# Altium schematic symbol library jlcpcb_2025_04_resistors_extended_1210.schlib: 2670 symbols (part 12 of 14) (continued)
## RTT12R47JTP
designator R?  Resistance: 470mΩ  (hidden comment: *)
Resistor, 470mΩ, ±5%, 500mW, 200V, ±200ppm/℃, -55℃~+155℃, SMD 1210; Manufacturer: Uniroyal; Manufacturer Part Number: RTT12R47JTP; Supplier 1: LCSC; Supplier Part Number 1: C159280; JLCPCB Part Number: C159280; Power Rating: 500mW; Category: Resistors; Package Size: 1210; JLCPCB Basic Part: Yes; Tolerance: ±5%; Voltage Rating: 200V; Temperature Coefficient: ±200ppm/℃; Temperature Rating: -55℃~+155℃; ComponentLink1Description: Datasheet; ComponentLink1URL: https://wmsc.lcsc.com/wmsc/upload/file/pdf/v2/lcsc/2304140030_RALEC-RTT12R47JTP_C159280.pdf; ComponentLink2Description: JLCPCB Part URL; ComponentLink2URL: https://jlcpcb.com/partdetail/C159280
pins: 1, 2
1 alternate drawing of the same symbol

## RTT12R050FTP
designator R?  Resistance: 50mΩ  (hidden comment: *)
Resistor, 50mΩ, ±1%, 500mW, 200V, ±400ppm/℃, -55℃~+155℃, SMD 1210; Manufacturer: Uniroyal; Manufacturer Part Number: RTT12R050FTP; Supplier 1: LCSC; Supplier Part Number 1: C333253; JLCPCB Part Number: C333253; Power Rating: 500mW; Category: Resistors; Package Size: 1210; JLCPCB Basic Part: Yes; Tolerance: ±1%; Voltage Rating: 200V; Temperature Coefficient: ±400ppm/℃; Temperature Rating: -55℃~+155℃; ComponentLink1Description: Datasheet; ComponentLink1URL: https://wmsc.lcsc.com/wmsc/upload/file/pdf/v2/lcsc/2304140030_RALEC-RTT12R050FTP_C333253.pdf; ComponentLink2Description: JLCPCB Part URL; ComponentLink2URL: https://jlcpcb.com/partdetail/C333253
pins: 1, 2
1 alternate drawing of the same symbol

## RTT12R50JTP
designator R?  Resistance: 500mΩ  (hidden comment: *)
Resistor, 500mΩ, ±5%, 500mW, 200V, ±200ppm/℃, -55℃~+155℃, SMD 1210; Manufacturer: Uniroyal; Manufacturer Part Number: RTT12R50JTP; Supplier 1: LCSC; Supplier Part Number 1: C159279; JLCPCB Part Number: C159279; Power Rating: 500mW; Category: Resistors; Package Size: 1210; JLCPCB Basic Part: Yes; Tolerance: ±5%; Voltage Rating: 200V; Temperature Coefficient: ±200ppm/℃; Temperature Rating: -55℃~+155℃; ComponentLink1Description: Datasheet; ComponentLink1URL: https://wmsc.lcsc.com/wmsc/upload/file/pdf/v2/lcsc/2304140030_RALEC-RTT12R50JTP_C159279.pdf; ComponentLink2Description: JLCPCB Part URL; ComponentLink2URL: https://jlcpcb.com/partdetail/C159279
pins: 1, 2
1 alternate drawing of the same symbol

## RTT12R51JTP
designator R?  Resistance: 510mΩ  (hidden comment: *)
Resistor, 510mΩ, ±5%, 500mW, 200V, ±200ppm/℃, -55℃~+155℃, SMD 1210; Manufacturer: Uniroyal; Manufacturer Part Number: RTT12R51JTP; Supplier 1: LCSC; Supplier Part Number 1: C159277; JLCPCB Part Number: C159277; Power Rating: 500mW; Category: Resistors; Package Size: 1210; JLCPCB Basic Part: Yes; Tolerance: ±5%; Voltage Rating: 200V; Temperature Coefficient: ±200ppm/℃; Temperature Rating: -55℃~+155℃; ComponentLink1Description: Datasheet; ComponentLink1URL: https://wmsc.lcsc.com/wmsc/upload/file/pdf/v2/lcsc/2304140030_RALEC-RTT12R51JTP_C159277.pdf; ComponentLink2Description: JLCPCB Part URL; ComponentLink2URL: https://jlcpcb.com/partdetail/C159277
pins: 1, 2
1 alternate drawing of the same symbol

## RTT12R056FTP
designator R?  Resistance: 56mΩ  (hidden comment: *)
Resistor, 56mΩ, ±1%, 500mW, 200V, ±400ppm/℃, -55℃~+155℃, SMD 1210; Manufacturer: Uniroyal; Manufacturer Part Number: RTT12R056FTP; Supplier 1: LCSC; Supplier Part Number 1: C333254; JLCPCB Part Number: C333254; Power Rating: 500mW; Category: Resistors; Package Size: 1210; JLCPCB Basic Part: Yes; Tolerance: ±1%; Voltage Rating: 200V; Temperature Coefficient: ±400ppm/℃; Temperature Rating: -55℃~+155℃; ComponentLink1Description: Datasheet; ComponentLink1URL: https://wmsc.lcsc.com/wmsc/upload/file/pdf/v2/lcsc/2304140030_RALEC-RTT12R056FTP_C333254.pdf; ComponentLink2Description: JLCPCB Part URL; ComponentLink2URL: https://jlcpcb.com/partdetail/C333254
pins: 1, 2
1 alternate drawing of the same symbol

## RTT12R062JTP
designator R?  Resistance: 62mΩ  (hidden comment: *)
Resistor, 62mΩ, ±5%, 500mW, 200V, ±400ppm/℃, -55℃~+155℃, SMD 1210; Manufacturer: Uniroyal; Manufacturer Part Number: RTT12R062JTP; Supplier 1: LCSC; Supplier Part Number 1: C159302; JLCPCB Part Number: C159302; Power Rating: 500mW; Category: Resistors; Package Size: 1210; JLCPCB Basic Part: Yes; Tolerance: ±5%; Voltage Rating: 200V; Temperature Coefficient: ±400ppm/℃; Temperature Rating: -55℃~+155℃; ComponentLink1Description: Datasheet; ComponentLink1URL: https://wmsc.lcsc.com/wmsc/upload/file/pdf/v2/lcsc/2304140030_RALEC-RTT12R062JTP_C159302.pdf; ComponentLink2Description: JLCPCB Part URL; ComponentLink2URL: https://jlcpcb.com/partdetail/C159302
pins: 1, 2
1 alternate drawing of the same symbol

## RTT12R62JTP
designator R?  Resistance: 620mΩ  (hidden comment: *)
Resistor, 620mΩ, ±5%, 500mW, 200V, ±200ppm/℃, -55℃~+155℃, SMD 1210; Manufacturer: Uniroyal; Manufacturer Part Number: RTT12R62JTP; Supplier 1: LCSC; Supplier Part Number 1: C159276; JLCPCB Part Number: C159276; Power Rating: 500mW; Category: Resistors; Package Size: 1210; JLCPCB Basic Part: Yes; Tolerance: ±5%; Voltage Rating: 200V; Temperature Coefficient: ±200ppm/℃; Temperature Rating: -55℃~+155℃; ComponentLink1Description: Datasheet; ComponentLink1URL: https://wmsc.lcsc.com/wmsc/upload/file/pdf/v2/lcsc/2304140030_RALEC-RTT12R62JTP_C159276.pdf; ComponentLink2Description: JLCPCB Part URL; ComponentLink2URL: https://jlcpcb.com/partdetail/C159276
pins: 1, 2
1 alternate drawing of the same symbol

## RTT12R068FTP
designator R?  Resistance: 68mΩ  (hidden comment: *)
Resistor, 68mΩ, ±1%, 500mW, 200V, ±400ppm/℃, -55℃~+155℃, SMD 1210; Manufacturer: Uniroyal; Manufacturer Part Number: RTT12R068FTP; Supplier 1: LCSC; Supplier Part Number 1: C333256; JLCPCB Part Number: C333256; Power Rating: 500mW; Category: Resistors; Package Size: 1210; JLCPCB Basic Part: Yes; Tolerance: ±1%; Voltage Rating: 200V; Temperature Coefficient: ±400ppm/℃; Temperature Rating: -55℃~+155℃; ComponentLink1Description: Datasheet; ComponentLink1URL: https://wmsc.lcsc.com/wmsc/upload/file/pdf/v2/lcsc/2304140030_RALEC-RTT12R068FTP_C333256.pdf; ComponentLink2Description: JLCPCB Part URL; ComponentLink2URL: https://jlcpcb.com/partdetail/C333256
pins: 1, 2
1 alternate drawing of the same symbol

## RTT12R075FTP
designator R?  Resistance: 75mΩ  (hidden comment: *)
Resistor, 75mΩ, ±1%, 500mW, 200V, ±400ppm/℃, -55℃~+155℃, SMD 1210; Manufacturer: Uniroyal; Manufacturer Part Number: RTT12R075FTP; Supplier 1: LCSC; Supplier Part Number 1: C333258; JLCPCB Part Number: C333258; Power Rating: 500mW; Category: Resistors; Package Size: 1210; JLCPCB Basic Part: Yes; Tolerance: ±1%; Voltage Rating: 200V; Temperature Coefficient: ±400ppm/℃; Temperature Rating: -55℃~+155℃; ComponentLink1Description: Datasheet; ComponentLink1URL: https://wmsc.lcsc.com/wmsc/upload/file/pdf/v2/lcsc/2304140030_RALEC-RTT12R075FTP_C333258.pdf; ComponentLink2Description: JLCPCB Part URL; ComponentLink2URL: https://jlcpcb.com/partdetail/C333258
pins: 1, 2
1 alternate drawing of the same symbol

## RTT12R75JTP
designator R?  Resistance: 750mΩ  (hidden comment: *)
Resistor, 750mΩ, ±5%, 500mW, 200V, ±200ppm/℃, -55℃~+155℃, SMD 1210; Manufacturer: Uniroyal; Manufacturer Part Number: RTT12R75JTP; Supplier 1: LCSC; Supplier Part Number 1: C159275; JLCPCB Part Number: C159275; Power Rating: 500mW; Category: Resistors; Package Size: 1210; JLCPCB Basic Part: Yes; Tolerance: ±5%; Voltage Rating: 200V; Temperature Coefficient: ±200ppm/℃; Temperature Rating: -55℃~+155℃; ComponentLink1Description: Datasheet; ComponentLink1URL: https://wmsc.lcsc.com/wmsc/upload/file/pdf/v2/lcsc/2304140030_RALEC-RTT12R75JTP_C159275.pdf; ComponentLink2Description: JLCPCB Part URL; ComponentLink2URL: https://jlcpcb.com/partdetail/C159275
pins: 1, 2
1 alternate drawing of the same symbol

## RTT12R91JTP
designator R?  Resistance: 910mΩ  (hidden comment: *)
Resistor, 910mΩ, ±5%, 500mW, 200V, ±200ppm/℃, -55℃~+155℃, SMD 1210; Manufacturer: Uniroyal; Manufacturer Part Number: RTT12R91JTP; Supplier 1: LCSC; Supplier Part Number 1: C159272; JLCPCB Part Number: C159272; Power Rating: 500mW; Category: Resistors; Package Size: 1210; JLCPCB Basic Part: Yes; Tolerance: ±5%; Voltage Rating: 200V; Temperature Coefficient: ±200ppm/℃; Temperature Rating: -55℃~+155℃; ComponentLink1Description: Datasheet; ComponentLink1URL: https://wmsc.lcsc.com/wmsc/upload/file/pdf/v2/lcsc/2304140030_RALEC-RTT12R91JTP_C159272.pdf; ComponentLink2Description: JLCPCB Part URL; ComponentLink2URL: https://jlcpcb.com/partdetail/C159272
pins: 1, 2
1 alternate drawing of the same symbol

## RTT12R100FTP
designator R?  Resistance: 100mΩ  (hidden comment: *)
Resistor, 100mΩ, ±1%, 500mW, 200V, ±200ppm/℃, -55℃~+155℃, SMD 1210; Manufacturer: Uniroyal; Manufacturer Part Number: RTT12R100FTP; Supplier 1: LCSC; Supplier Part Number 1: C105050; JLCPCB Part Number: C105050; Power Rating: 500mW; Category: Resistors; Package Size: 1210; JLCPCB Basic Part: Yes; Tolerance: ±1%; Voltage Rating: 200V; Temperature Coefficient: ±200ppm/℃; Temperature Rating: -55℃~+155℃; ComponentLink1Description: Datasheet; ComponentLink1URL: https://wmsc.lcsc.com/wmsc/upload/file/pdf/v2/lcsc/2304140030_RALEC-RTT12R100FTP_C105050.pdf; ComponentLink2Description: JLCPCB Part URL; ComponentLink2URL: https://jlcpcb.com/partdetail/C105050
pins: 1, 2
1 alternate drawing of the same symbol

## RTT12R110FTP
designator R?  Resistance: 110mΩ  (hidden comment: *)
Resistor, 110mΩ, ±1%, 500mW, 200V, ±200ppm/℃, -55℃~+155℃, SMD 1210; Manufacturer: Uniroyal; Manufacturer Part Number: RTT12R110FTP; Supplier 1: LCSC; Supplier Part Number 1: C159300; JLCPCB Part Number: C159300; Power Rating: 500mW; Category: Resistors; Package Size: 1210; JLCPCB Basic Part: Yes; Tolerance: ±1%; Voltage Rating: 200V; Temperature Coefficient: ±200ppm/℃; Temperature Rating: -55℃~+155℃; ComponentLink1Description: Datasheet; ComponentLink1URL: https://wmsc.lcsc.com/wmsc/upload/file/pdf/v2/lcsc/2304140030_RALEC-RTT12R110FTP_C159300.pdf; ComponentLink2Description: JLCPCB Part URL; ComponentLink2URL: https://jlcpcb.com/partdetail/C159300
pins: 1, 2
1 alternate drawing of the same symbol

## RTT12R120FTP
designator R?  Resistance: 120mΩ  (hidden comment: *)
Resistor, 120mΩ, ±1%, 500mW, 200V, ±200ppm/℃, -55℃~+155℃, SMD 1210; Manufacturer: Uniroyal; Manufacturer Part Number: RTT12R120FTP; Supplier 1: LCSC; Supplier Part Number 1: C159299; JLCPCB Part Number: C159299; Power Rating: 500mW; Category: Resistors; Package Size: 1210; JLCPCB Basic Part: Yes; Tolerance: ±1%; Voltage Rating: 200V; Temperature Coefficient: ±200ppm/℃; Temperature Rating: -55℃~+155℃; ComponentLink1Description: Datasheet; ComponentLink1URL: https://wmsc.lcsc.com/wmsc/upload/file/pdf/v2/lcsc/2304140030_RALEC-RTT12R120FTP_C159299.pdf; ComponentLink2Description: JLCPCB Part URL; ComponentLink2URL: https://jlcpcb.com/partdetail/C159299
pins: 1, 2
1 alternate drawing of the same symbol

## RTT12R150FTP
designator R?  Resistance: 150mΩ  (hidden comment: *)
Resistor, 150mΩ, ±1%, 500mW, 200V, ±200ppm/℃, -55℃~+155℃, SMD 1210; Manufacturer: Uniroyal; Manufacturer Part Number: RTT12R150FTP; Supplier 1: LCSC; Supplier Part Number 1: C333262; JLCPCB Part Number: C333262; Power Rating: 500mW; Category: Resistors; Package Size: 1210; JLCPCB Basic Part: Yes; Tolerance: ±1%; Voltage Rating: 200V; Temperature Coefficient: ±200ppm/℃; Temperature Rating: -55℃~+155℃; ComponentLink1Description: Datasheet; ComponentLink1URL: https://wmsc.lcsc.com/wmsc/upload/file/pdf/v2/lcsc/2304140030_RALEC-RTT12R150FTP_C333262.pdf; ComponentLink2Description: JLCPCB Part URL; ComponentLink2URL: https://jlcpcb.com/partdetail/C333262
pins: 1, 2
1 alternate drawing of the same symbol

## RTT12R180FTP
designator R?  Resistance: 180mΩ  (hidden comment: *)
Resistor, 180mΩ, ±1%, 500mW, 200V, ±200ppm/℃, -55℃~+155℃, SMD 1210; Manufacturer: Uniroyal; Manufacturer Part Number: RTT12R180FTP; Supplier 1: LCSC; Supplier Part Number 1: C159390; JLCPCB Part Number: C159390; Power Rating: 500mW; Category: Resistors; Package Size: 1210; JLCPCB Basic Part: Yes; Tolerance: ±1%; Voltage Rating: 200V; Temperature Coefficient: ±200ppm/℃; Temperature Rating: -55℃~+155℃; ComponentLink1Description: Datasheet; ComponentLink1URL: https://wmsc.lcsc.com/wmsc/upload/file/pdf/v2/lcsc/2304140030_RALEC-RTT12R180FTP_C159390.pdf; ComponentLink2Description: JLCPCB Part URL; ComponentLink2URL: https://jlcpcb.com/partdetail/C159390
pins: 1, 2
1 alternate drawing of the same symbol

## RTT12R200FTP
designator R?  Resistance: 200mΩ  (hidden comment: *)
Resistor, 200mΩ, ±1%, 500mW, 200V, ±200ppm/℃, -55℃~+155℃, SMD 1210; Manufacturer: Uniroyal; Manufacturer Part Number: RTT12R200FTP; Supplier 1: LCSC; Supplier Part Number 1: C159296; JLCPCB Part Number: C159296; Power Rating: 500mW; Category: Resistors; Package Size: 1210; JLCPCB Basic Part: Yes; Tolerance: ±1%; Voltage Rating: 200V; Temperature Coefficient: ±200ppm/℃; Temperature Rating: -55℃~+155℃; ComponentLink1Description: Datasheet; ComponentLink1URL: https://wmsc.lcsc.com/wmsc/upload/file/pdf/v2/lcsc/2304140030_RALEC-RTT12R200FTP_C159296.pdf; ComponentLink2Description: JLCPCB Part URL; ComponentLink2URL: https://jlcpcb.com/partdetail/C159296
pins: 1, 2
1 alternate drawing of the same symbol

## RTT12R240FTP
designator R?  Resistance: 240mΩ  (hidden comment: *)
Resistor, 240mΩ, ±1%, 500mW, 200V, ±200ppm/℃, -55℃~+155℃, SMD 1210; Manufacturer: Uniroyal; Manufacturer Part Number: RTT12R240FTP; Supplier 1: LCSC; Supplier Part Number 1: C159292; JLCPCB Part Number: C159292; Power Rating: 500mW; Category: Resistors; Package Size: 1210; JLCPCB Basic Part: Yes; Tolerance: ±1%; Voltage Rating: 200V; Temperature Coefficient: ±200ppm/℃; Temperature Rating: -55℃~+155℃; ComponentLink1Description: Datasheet; ComponentLink1URL: https://wmsc.lcsc.com/wmsc/upload/file/pdf/v2/lcsc/2304140030_RALEC-RTT12R240FTP_C159292.pdf; ComponentLink2Description: JLCPCB Part URL; ComponentLink2URL: https://jlcpcb.com/partdetail/C159292
pins: 1, 2
1 alternate drawing of the same symbol

## RTT12R250FTP
designator R?  Resistance: 250mΩ  (hidden comment: *)
Resistor, 250mΩ, ±1%, 500mW, 200V, ±200ppm/℃, -55℃~+155℃, SMD 1210; Manufacturer: Uniroyal; Manufacturer Part Number: RTT12R250FTP; Supplier 1: LCSC; Supplier Part Number 1: C333265; JLCPCB Part Number: C333265; Power Rating: 500mW; Category: Resistors; Package Size: 1210; JLCPCB Basic Part: Yes; Tolerance: ±1%; Voltage Rating: 200V; Temperature Coefficient: ±200ppm/℃; Temperature Rating: -55℃~+155℃; ComponentLink1Description: Datasheet; ComponentLink1URL: https://wmsc.lcsc.com/wmsc/upload/file/pdf/v2/lcsc/2304140030_RALEC-RTT12R250FTP_C333265.pdf; ComponentLink2Description: JLCPCB Part URL; ComponentLink2URL: https://jlcpcb.com/partdetail/C333265
pins: 1, 2
1 alternate drawing of the same symbol

## RTT12R300FTP
designator R?  Resistance: 300mΩ  (hidden comment: *)
Resistor, 300mΩ, ±1%, 500mW, 200V, ±200ppm/℃, -55℃~+155℃, SMD 1210; Manufacturer: Uniroyal; Manufacturer Part Number: RTT12R300FTP; Supplier 1: LCSC; Supplier Part Number 1: C159287; JLCPCB Part Number: C159287; Power Rating: 500mW; Category: Resistors; Package Size: 1210; JLCPCB Basic Part: Yes; Tolerance: ±1%; Voltage Rating: 200V; Temperature Coefficient: ±200ppm/℃; Temperature Rating: -55℃~+155℃; ComponentLink1Description: Datasheet; ComponentLink1URL: https://wmsc.lcsc.com/wmsc/upload/file/pdf/v2/lcsc/2304140030_RALEC-RTT12R300FTP_C159287.pdf; ComponentLink2Description: JLCPCB Part URL; ComponentLink2URL: https://jlcpcb.com/partdetail/C159287
pins: 1, 2
1 alternate drawing of the same symbol

## RTT12R360FTP
designator R?  Resistance: 360mΩ  (hidden comment: *)
Resistor, 360mΩ, ±1%, 500mW, 200V, ±200ppm/℃, -55℃~+155℃, SMD 1210; Manufacturer: Uniroyal; Manufacturer Part Number: RTT12R360FTP; Supplier 1: LCSC; Supplier Part Number 1: C159284; JLCPCB Part Number: C159284; Power Rating: 500mW; Category: Resistors; Package Size: 1210; JLCPCB Basic Part: Yes; Tolerance: ±1%; Voltage Rating: 200V; Temperature Coefficient: ±200ppm/℃; Temperature Rating: -55℃~+155℃; ComponentLink1Description: Datasheet; ComponentLink1URL: https://wmsc.lcsc.com/wmsc/upload/file/pdf/v2/lcsc/2304140030_RALEC-RTT12R360FTP_C159284.pdf; ComponentLink2Description: JLCPCB Part URL; ComponentLink2URL: https://jlcpcb.com/partdetail/C159284
pins: 1, 2
1 alternate drawing of the same symbol

## RTT12R390FTP
designator R?  Resistance: 390mΩ  (hidden comment: *)
Resistor, 390mΩ, ±1%, 500mW, 200V, ±200ppm/℃, -55℃~+155℃, SMD 1210; Manufacturer: Uniroyal; Manufacturer Part Number: RTT12R390FTP; Supplier 1: LCSC; Supplier Part Number 1: C159283; JLCPCB Part Number: C159283; Power Rating: 500mW; Category: Resistors; Package Size: 1210; JLCPCB Basic Part: Yes; Tolerance: ±1%; Voltage Rating: 200V; Temperature Coefficient: ±200ppm/℃; Temperature Rating: -55℃~+155℃; ComponentLink1Description: Datasheet; ComponentLink1URL: https://wmsc.lcsc.com/wmsc/upload/file/pdf/v2/lcsc/2304140030_RALEC-RTT12R390FTP_C159283.pdf; ComponentLink2Description: JLCPCB Part URL; ComponentLink2URL: https://jlcpcb.com/partdetail/C159283
pins: 1, 2
1 alternate drawing of the same symbol

## RTT12R470FTP
designator R?  Resistance: 470mΩ  (hidden comment: *)
Resistor, 470mΩ, ±1%, 500mW, 200V, ±200ppm/℃, -55℃~+155℃, SMD 1210; Manufacturer: Uniroyal; Manufacturer Part Number: RTT12R470FTP; Supplier 1: LCSC; Supplier Part Number 1: C159281; JLCPCB Part Number: C159281; Power Rating: 500mW; Category: Resistors; Package Size: 1210; JLCPCB Basic Part: Yes; Tolerance: ±1%; Voltage Rating: 200V; Temperature Coefficient: ±200ppm/℃; Temperature Rating: -55℃~+155℃; ComponentLink1Description: Datasheet; ComponentLink1URL: https://wmsc.lcsc.com/wmsc/upload/file/pdf/v2/lcsc/2304140030_RALEC-RTT12R470FTP_C159281.pdf; ComponentLink2Description: JLCPCB Part URL; ComponentLink2URL: https://jlcpcb.com/partdetail/C159281
pins: 1, 2
1 alternate drawing of the same symbol

## RTT12R500FTP
designator R?  Resistance: 500mΩ  (hidden comment: *)
Resistor, 500mΩ, ±1%, 500mW, 200V, ±200ppm/℃, -55℃~+155℃, SMD 1210; Manufacturer: Uniroyal; Manufacturer Part Number: RTT12R500FTP; Supplier 1: LCSC; Supplier Part Number 1: C105052; JLCPCB Part Number: C105052; Power Rating: 500mW; Category: Resistors; Package Size: 1210; JLCPCB Basic Part: Yes; Tolerance: ±1%; Voltage Rating: 200V; Temperature Coefficient: ±200ppm/℃; Temperature Rating: -55℃~+155℃; ComponentLink1Description: Datasheet; ComponentLink1URL: https://wmsc.lcsc.com/wmsc/upload/file/pdf/v2/lcsc/2304140030_RALEC-RTT12R500FTP_C105052.pdf; ComponentLink2Description: JLCPCB Part URL; ComponentLink2URL: https://jlcpcb.com/partdetail/C105052
pins: 1, 2
1 alternate drawing of the same symbol

## RTT12R510FTP
designator R?  Resistance: 510mΩ  (hidden comment: *)
Resistor, 510mΩ, ±1%, 500mW, 200V, ±200ppm/℃, -55℃~+155℃, SMD 1210; Manufacturer: Uniroyal; Manufacturer Part Number: RTT12R510FTP; Supplier 1: LCSC; Supplier Part Number 1: C159278; JLCPCB Part Number: C159278; Power Rating: 500mW; Category: Resistors; Package Size: 1210; JLCPCB Basic Part: Yes; Tolerance: ±1%; Voltage Rating: 200V; Temperature Coefficient: ±200ppm/℃; Temperature Rating: -55℃~+155℃; ComponentLink1Description: Datasheet; ComponentLink1URL: https://wmsc.lcsc.com/wmsc/upload/file/pdf/v2/lcsc/2304140030_RALEC-RTT12R510FTP_C159278.pdf; ComponentLink2Description: JLCPCB Part URL; ComponentLink2URL: https://jlcpcb.com/partdetail/C159278
pins: 1, 2
1 alternate drawing of the same symbol

## RTT12R560FTP
designator R?  Resistance: 560mΩ  (hidden comment: *)
Resistor, 560mΩ, ±1%, 500mW, 200V, ±200ppm/℃, -55℃~+155℃, SMD 1210; Manufacturer: Uniroyal; Manufacturer Part Number: RTT12R560FTP; Supplier 1: LCSC; Supplier Part Number 1: C333269; JLCPCB Part Number: C333269; Power Rating: 500mW; Category: Resistors; Package Size: 1210; JLCPCB Basic Part: Yes; Tolerance: ±1%; Voltage Rating: 200V; Temperature Coefficient: ±200ppm/℃; Temperature Rating: -55℃~+155℃; ComponentLink1Description: Datasheet; ComponentLink1URL: https://wmsc.lcsc.com/wmsc/upload/file/pdf/v2/lcsc/2304140030_RALEC-RTT12R560FTP_C333269.pdf; ComponentLink2Description: JLCPCB Part URL; ComponentLink2URL: https://jlcpcb.com/partdetail/C333269
pins: 1, 2
1 alternate drawing of the same symbol

## RTT12R620FTP
designator R?  Resistance: 620mΩ  (hidden comment: *)
Resistor, 620mΩ, ±1%, 500mW, 200V, ±200ppm/℃, -55℃~+155℃, SMD 1210; Manufacturer: Uniroyal; Manufacturer Part Number: RTT12R620FTP; Supplier 1: LCSC; Supplier Part Number 1: C159389; JLCPCB Part Number: C159389; Power Rating: 500mW; Category: Resistors; Package Size: 1210; JLCPCB Basic Part: Yes; Tolerance: ±1%; Voltage Rating: 200V; Temperature Coefficient: ±200ppm/℃; Temperature Rating: -55℃~+155℃; ComponentLink1Description: Datasheet; ComponentLink1URL: https://wmsc.lcsc.com/wmsc/upload/file/pdf/v2/lcsc/2304140030_RALEC-RTT12R620FTP_C159389.pdf; ComponentLink2Description: JLCPCB Part URL; ComponentLink2URL: https://jlcpcb.com/partdetail/C159389
pins: 1, 2
1 alternate drawing of the same symbol

## RTT12R680FTP
designator R?  Resistance: 680mΩ  (hidden comment: *)
Resistor, 680mΩ, ±1%, 500mW, 200V, ±200ppm/℃, -55℃~+155℃, SMD 1210; Manufacturer: Uniroyal; Manufacturer Part Number: RTT12R680FTP; Supplier 1: LCSC; Supplier Part Number 1: C305062; JLCPCB Part Number: C305062; Power Rating: 500mW; Category: Resistors; Package Size: 1210; JLCPCB Basic Part: Yes; Tolerance: ±1%; Voltage Rating: 200V; Temperature Coefficient: ±200ppm/℃; Temperature Rating: -55℃~+155℃; ComponentLink1Description: Datasheet; ComponentLink1URL: https://wmsc.lcsc.com/wmsc/upload/file/pdf/v2/lcsc/2304140030_RALEC-RTT12R680FTP_C305062.pdf; ComponentLink2Description: JLCPCB Part URL; ComponentLink2URL: https://jlcpcb.com/partdetail/C305062
pins: 1, 2
1 alternate drawing of the same symbol

## RTT12R750FTP
designator R?  Resistance: 750mΩ  (hidden comment: *)
Resistor, 750mΩ, ±1%, 500mW, 200V, ±200ppm/℃, -55℃~+155℃, SMD 1210; Manufacturer: Uniroyal; Manufacturer Part Number: RTT12R750FTP; Supplier 1: LCSC; Supplier Part Number 1: C105053; JLCPCB Part Number: C105053; Power Rating: 500mW; Category: Resistors; Package Size: 1210; JLCPCB Basic Part: Yes; Tolerance: ±1%; Voltage Rating: 200V; Temperature Coefficient: ±200ppm/℃; Temperature Rating: -55℃~+155℃; ComponentLink1Description: Datasheet; ComponentLink1URL: https://wmsc.lcsc.com/wmsc/upload/file/pdf/v2/lcsc/2304140030_RALEC-RTT12R750FTP_C105053.pdf; ComponentLink2Description: JLCPCB Part URL; ComponentLink2URL: https://jlcpcb.com/partdetail/C105053
pins: 1, 2
1 alternate drawing of the same symbol

## RTT12R910FTP
designator R?  Resistance: 910mΩ  (hidden comment: *)
Resistor, 910mΩ, ±1%, 500mW, 200V, ±200ppm/℃, -55℃~+155℃, SMD 1210; Manufacturer: Uniroyal; Manufacturer Part Number: RTT12R910FTP; Supplier 1: LCSC; Supplier Part Number 1: C333272; JLCPCB Part Number: C333272; Power Rating: 500mW; Category: Resistors; Package Size: 1210; JLCPCB Basic Part: Yes; Tolerance: ±1%; Voltage Rating: 200V; Temperature Coefficient: ±200ppm/℃; Temperature Rating: -55℃~+155℃; ComponentLink1Description: Datasheet; ComponentLink1URL: https://wmsc.lcsc.com/wmsc/upload/file/pdf/v2/lcsc/2304140030_RALEC-RTT12R910FTP_C333272.pdf; ComponentLink2Description: JLCPCB Part URL; ComponentLink2URL: https://jlcpcb.com/partdetail/C333272
pins: 1, 2
1 alternate drawing of the same symbol

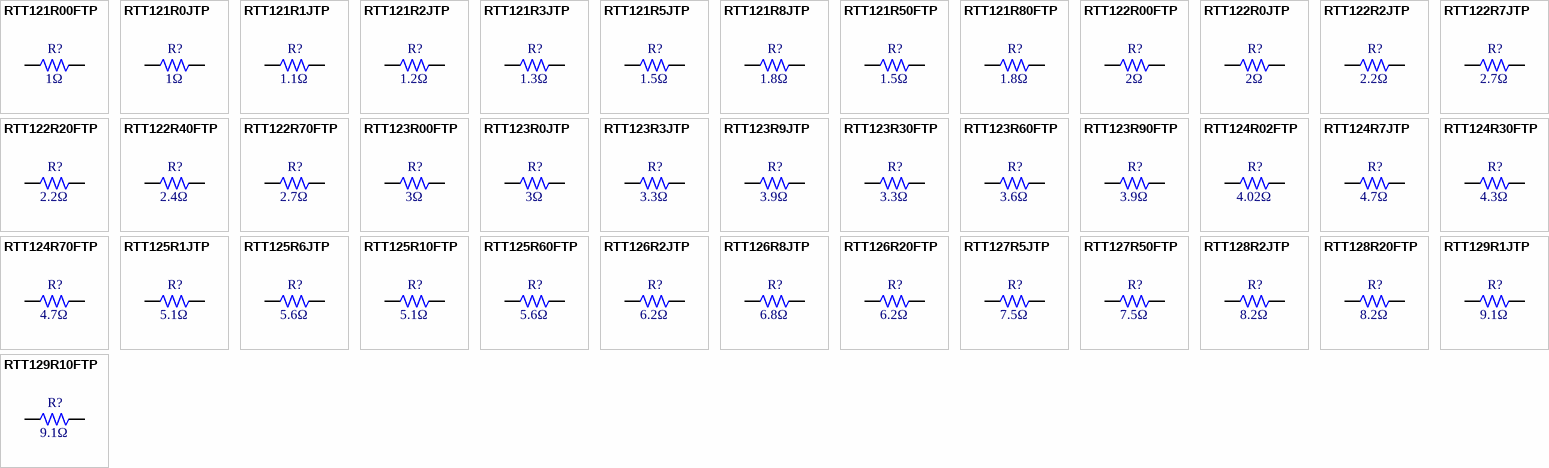
[diagram p58: symbols RTT121R00FTP to RTT129R10FTP]

## RTT121R00FTP
designator R?  Resistance: 1Ω  (hidden comment: *)
Resistor, 1Ω, ±1%, 500mW, 200V, ±200ppm/℃, -55℃~+155℃, SMD 1210; Manufacturer: Uniroyal; Manufacturer Part Number: RTT121R00FTP; Supplier 1: LCSC; Supplier Part Number 1: C159369; JLCPCB Part Number: C159369; Power Rating: 500mW; Category: Resistors; Package Size: 1210; JLCPCB Basic Part: Yes; Tolerance: ±1%; Voltage Rating: 200V; Temperature Coefficient: ±200ppm/℃; Temperature Rating: -55℃~+155℃; ComponentLink1Description: Datasheet; ComponentLink1URL: https://wmsc.lcsc.com/wmsc/upload/file/pdf/v2/lcsc/2304140030_RALEC-RTT121R00FTP_C159369.pdf; ComponentLink2Description: JLCPCB Part URL; ComponentLink2URL: https://jlcpcb.com/partdetail/C159369
pins: 1, 2
1 alternate drawing of the same symbol

## RTT121R0JTP
designator R?  Resistance: 1Ω  (hidden comment: *)
Resistor, 1Ω, ±5%, 500mW, 200V, ±200ppm/℃, -55℃~+155℃, SMD 1210; Manufacturer: Uniroyal; Manufacturer Part Number: RTT121R0JTP; Supplier 1: LCSC; Supplier Part Number 1: C104975; JLCPCB Part Number: C104975; Power Rating: 500mW; Category: Resistors; Package Size: 1210; JLCPCB Basic Part: Yes; Tolerance: ±5%; Voltage Rating: 200V; Temperature Coefficient: ±200ppm/℃; Temperature Rating: -55℃~+155℃; ComponentLink1Description: Datasheet; ComponentLink1URL: https://wmsc.lcsc.com/wmsc/upload/file/pdf/v2/lcsc/2304140030_RALEC-RTT121R0JTP_C104975.pdf; ComponentLink2Description: JLCPCB Part URL; ComponentLink2URL: https://jlcpcb.com/partdetail/C104975
pins: 1, 2
1 alternate drawing of the same symbol

## RTT121R1JTP
designator R?  Resistance: 1.1Ω  (hidden comment: *)
Resistor, 1.1Ω, ±5%, 500mW, 200V, ±200ppm/℃, -55℃~+155℃, SMD 1210; Manufacturer: Uniroyal; Manufacturer Part Number: RTT121R1JTP; Supplier 1: LCSC; Supplier Part Number 1: C333140; JLCPCB Part Number: C333140; Power Rating: 500mW; Category: Resistors; Package Size: 1210; JLCPCB Basic Part: Yes; Tolerance: ±5%; Voltage Rating: 200V; Temperature Coefficient: ±200ppm/℃; Temperature Rating: -55℃~+155℃; ComponentLink1Description: Datasheet; ComponentLink1URL: https://wmsc.lcsc.com/wmsc/upload/file/pdf/v2/lcsc/2304140030_RALEC-RTT121R1JTP_C333140.pdf; ComponentLink2Description: JLCPCB Part URL; ComponentLink2URL: https://jlcpcb.com/partdetail/C333140
pins: 1, 2
1 alternate drawing of the same symbol

## RTT121R2JTP
designator R?  Resistance: 1.2Ω  (hidden comment: *)
Resistor, 1.2Ω, ±5%, 500mW, 200V, ±200ppm/℃, -55℃~+155℃, SMD 1210; Manufacturer: Uniroyal; Manufacturer Part Number: RTT121R2JTP; Supplier 1: LCSC; Supplier Part Number 1: C104976; JLCPCB Part Number: C104976; Power Rating: 500mW; Category: Resistors; Package Size: 1210; JLCPCB Basic Part: Yes; Tolerance: ±5%; Voltage Rating: 200V; Temperature Coefficient: ±200ppm/℃; Temperature Rating: -55℃~+155℃; ComponentLink1Description: Datasheet; ComponentLink1URL: https://wmsc.lcsc.com/wmsc/upload/file/pdf/v2/lcsc/2304140030_RALEC-RTT121R2JTP_C104976.pdf; ComponentLink2Description: JLCPCB Part URL; ComponentLink2URL: https://jlcpcb.com/partdetail/C104976
pins: 1, 2
1 alternate drawing of the same symbol

## RTT121R3JTP
designator R?  Resistance: 1.3Ω  (hidden comment: *)
Resistor, 1.3Ω, ±5%, 500mW, 200V, ±200ppm/℃, -55℃~+155℃, SMD 1210; Manufacturer: Uniroyal; Manufacturer Part Number: RTT121R3JTP; Supplier 1: LCSC; Supplier Part Number 1: C159367; JLCPCB Part Number: C159367; Power Rating: 500mW; Category: Resistors; Package Size: 1210; JLCPCB Basic Part: Yes; Tolerance: ±5%; Voltage Rating: 200V; Temperature Coefficient: ±200ppm/℃; Temperature Rating: -55℃~+155℃; ComponentLink1Description: Datasheet; ComponentLink1URL: https://wmsc.lcsc.com/wmsc/upload/file/pdf/v2/lcsc/2304140030_RALEC-RTT121R3JTP_C159367.pdf; ComponentLink2Description: JLCPCB Part URL; ComponentLink2URL: https://jlcpcb.com/partdetail/C159367
pins: 1, 2
1 alternate drawing of the same symbol

## RTT121R5JTP
designator R?  Resistance: 1.5Ω  (hidden comment: *)
Resistor, 1.5Ω, ±5%, 500mW, 200V, ±200ppm/℃, -55℃~+155℃, SMD 1210; Manufacturer: Uniroyal; Manufacturer Part Number: RTT121R5JTP; Supplier 1: LCSC; Supplier Part Number 1: C104977; JLCPCB Part Number: C104977; Power Rating: 500mW; Category: Resistors; Package Size: 1210; JLCPCB Basic Part: Yes; Tolerance: ±5%; Voltage Rating: 200V; Temperature Coefficient: ±200ppm/℃; Temperature Rating: -55℃~+155℃; ComponentLink1Description: Datasheet; ComponentLink1URL: https://wmsc.lcsc.com/wmsc/upload/file/pdf/v2/lcsc/2304140030_RALEC-RTT121R5JTP_C104977.pdf; ComponentLink2Description: JLCPCB Part URL; ComponentLink2URL: https://jlcpcb.com/partdetail/C104977
pins: 1, 2
1 alternate drawing of the same symbol

## RTT121R8JTP
designator R?  Resistance: 1.8Ω  (hidden comment: *)
Resistor, 1.8Ω, ±5%, 500mW, 200V, ±200ppm/℃, -55℃~+155℃, SMD 1210; Manufacturer: Uniroyal; Manufacturer Part Number: RTT121R8JTP; Supplier 1: LCSC; Supplier Part Number 1: C104978; JLCPCB Part Number: C104978; Power Rating: 500mW; Category: Resistors; Package Size: 1210; JLCPCB Basic Part: Yes; Tolerance: ±5%; Voltage Rating: 200V; Temperature Coefficient: ±200ppm/℃; Temperature Rating: -55℃~+155℃; ComponentLink1Description: Datasheet; ComponentLink1URL: https://wmsc.lcsc.com/wmsc/upload/file/pdf/v2/lcsc/2304140030_RALEC-RTT121R8JTP_C104978.pdf; ComponentLink2Description: JLCPCB Part URL; ComponentLink2URL: https://jlcpcb.com/partdetail/C104978
pins: 1, 2
1 alternate drawing of the same symbol

## RTT121R50FTP
designator R?  Resistance: 1.5Ω  (hidden comment: *)
Resistor, 1.5Ω, ±1%, 500mW, ±200ppm/℃, SMD 1210; Manufacturer: Uniroyal; Manufacturer Part Number: RTT121R50FTP; Supplier 1: LCSC; Supplier Part Number 1: C159366; JLCPCB Part Number: C159366; Power Rating: 500mW; Category: Resistors; Package Size: 1210; JLCPCB Basic Part: Yes; Tolerance: ±1%; Temperature Coefficient: ±200ppm/℃; ComponentLink1Description: Datasheet; ComponentLink1URL: https://wmsc.lcsc.com/wmsc/upload/file/pdf/v2/lcsc/2304140030_RALEC-RTT121R50FTP_C159366.pdf; ComponentLink2Description: JLCPCB Part URL; ComponentLink2URL: https://jlcpcb.com/partdetail/C159366
pins: 1, 2
1 alternate drawing of the same symbol

## RTT121R80FTP
designator R?  Resistance: 1.8Ω  (hidden comment: *)
Resistor, 1.8Ω, ±1%, 500mW, 200V, ±200ppm/℃, -55℃~+155℃, SMD 1210; Manufacturer: Uniroyal; Manufacturer Part Number: RTT121R80FTP; Supplier 1: LCSC; Supplier Part Number 1: C458694; JLCPCB Part Number: C458694; Power Rating: 500mW; Category: Resistors; Package Size: 1210; JLCPCB Basic Part: Yes; Tolerance: ±1%; Voltage Rating: 200V; Temperature Coefficient: ±200ppm/℃; Temperature Rating: -55℃~+155℃; ComponentLink1Description: Datasheet; ComponentLink1URL: https://wmsc.lcsc.com/wmsc/upload/file/pdf/v2/lcsc/2304140030_RALEC-RTT121R80FTP_C458694.pdf; ComponentLink2Description: JLCPCB Part URL; ComponentLink2URL: https://jlcpcb.com/partdetail/C458694
pins: 1, 2
1 alternate drawing of the same symbol

## RTT122R00FTP
designator R?  Resistance: 2Ω  (hidden comment: *)
Resistor, 2Ω, ±1%, 500mW, ±200ppm/℃, SMD 1210; Manufacturer: Uniroyal; Manufacturer Part Number: RTT122R00FTP; Supplier 1: LCSC; Supplier Part Number 1: C159359; JLCPCB Part Number: C159359; Power Rating: 500mW; Category: Resistors; Package Size: 1210; JLCPCB Basic Part: Yes; Tolerance: ±1%; Temperature Coefficient: ±200ppm/℃; ComponentLink1Description: Datasheet; ComponentLink1URL: https://wmsc.lcsc.com/wmsc/upload/file/pdf/v2/lcsc/2304140030_RALEC-RTT122R00FTP_C159359.pdf; ComponentLink2Description: JLCPCB Part URL; ComponentLink2URL: https://jlcpcb.com/partdetail/C159359
pins: 1, 2
1 alternate drawing of the same symbol

## RTT122R0JTP
designator R?  Resistance: 2Ω  (hidden comment: *)
Resistor, 2Ω, ±5%, 500mW, 200V, ±200ppm/℃, -55℃~+155℃, SMD 1210; Manufacturer: Uniroyal; Manufacturer Part Number: RTT122R0JTP; Supplier 1: LCSC; Supplier Part Number 1: C105000; JLCPCB Part Number: C105000; Power Rating: 500mW; Category: Resistors; Package Size: 1210; JLCPCB Basic Part: Yes; Tolerance: ±5%; Voltage Rating: 200V; Temperature Coefficient: ±200ppm/℃; Temperature Rating: -55℃~+155℃; ComponentLink1Description: Datasheet; ComponentLink1URL: https://wmsc.lcsc.com/wmsc/upload/file/pdf/v2/lcsc/2304140030_RALEC-RTT122R0JTP_C105000.pdf; ComponentLink2Description: JLCPCB Part URL; ComponentLink2URL: https://jlcpcb.com/partdetail/C105000
pins: 1, 2
1 alternate drawing of the same symbol

## RTT122R2JTP
designator R?  Resistance: 2.2Ω  (hidden comment: *)
Resistor, 2.2Ω, ±5%, 500mW, 200V, ±200ppm/℃, -55℃~+155℃, SMD 1210; Manufacturer: Uniroyal; Manufacturer Part Number: RTT122R2JTP; Supplier 1: LCSC; Supplier Part Number 1: C10955; JLCPCB Part Number: C10955; Power Rating: 500mW; Category: Resistors; Package Size: 1210; JLCPCB Basic Part: Yes; Tolerance: ±5%; Voltage Rating: 200V; Temperature Coefficient: ±200ppm/℃; Temperature Rating: -55℃~+155℃; ComponentLink1Description: Datasheet; ComponentLink1URL: https://wmsc.lcsc.com/wmsc/upload/file/pdf/v2/lcsc/2304140030_RALEC-RTT122R2JTP_C10955.pdf; ComponentLink2Description: JLCPCB Part URL; ComponentLink2URL: https://jlcpcb.com/partdetail/C10955
pins: 1, 2
1 alternate drawing of the same symbol

## RTT122R7JTP
designator R?  Resistance: 2.7Ω  (hidden comment: *)
Resistor, 2.7Ω, ±5%, 500mW, 200V, ±200ppm/℃, -55℃~+155℃, SMD 1210; Manufacturer: Uniroyal; Manufacturer Part Number: RTT122R7JTP; Supplier 1: LCSC; Supplier Part Number 1: C2991299; JLCPCB Part Number: C2991299; Power Rating: 500mW; Category: Resistors; Package Size: 1210; JLCPCB Basic Part: Yes; Tolerance: ±5%; Voltage Rating: 200V; Temperature Coefficient: ±200ppm/℃; Temperature Rating: -55℃~+155℃; ComponentLink1Description: Datasheet; ComponentLink1URL: https://wmsc.lcsc.com/wmsc/upload/file/pdf/v2/lcsc/2204081930_RALEC-RTT122R7JTP_C2991299.pdf; ComponentLink2Description: JLCPCB Part URL; ComponentLink2URL: https://jlcpcb.com/partdetail/C2991299
pins: 1, 2
1 alternate drawing of the same symbol

## RTT122R20FTP
designator R?  Resistance: 2.2Ω  (hidden comment: *)
Resistor, 2.2Ω, ±1%, 500mW, 200V, ±200ppm/℃, -55℃~+155℃, SMD 1210; Manufacturer: Uniroyal; Manufacturer Part Number: RTT122R20FTP; Supplier 1: LCSC; Supplier Part Number 1: C159358; JLCPCB Part Number: C159358; Power Rating: 500mW; Category: Resistors; Package Size: 1210; JLCPCB Basic Part: Yes; Tolerance: ±1%; Voltage Rating: 200V; Temperature Coefficient: ±200ppm/℃; Temperature Rating: -55℃~+155℃; ComponentLink1Description: Datasheet; ComponentLink1URL: https://wmsc.lcsc.com/wmsc/upload/file/pdf/v2/lcsc/2304140030_RALEC-RTT122R20FTP_C159358.pdf; ComponentLink2Description: JLCPCB Part URL; ComponentLink2URL: https://jlcpcb.com/partdetail/C159358
pins: 1, 2
1 alternate drawing of the same symbol

## RTT122R40FTP
designator R?  Resistance: 2.4Ω  (hidden comment: *)
Resistor, 2.4Ω, ±1%, 500mW, 200V, ±200ppm/℃, -55℃~+155℃, SMD 1210; Manufacturer: Uniroyal; Manufacturer Part Number: RTT122R40FTP; Supplier 1: LCSC; Supplier Part Number 1: C333166; JLCPCB Part Number: C333166; Power Rating: 500mW; Category: Resistors; Package Size: 1210; JLCPCB Basic Part: Yes; Tolerance: ±1%; Voltage Rating: 200V; Temperature Coefficient: ±200ppm/℃; Temperature Rating: -55℃~+155℃; ComponentLink1Description: Datasheet; ComponentLink1URL: https://wmsc.lcsc.com/wmsc/upload/file/pdf/v2/lcsc/2304140030_RALEC-RTT122R40FTP_C333166.pdf; ComponentLink2Description: JLCPCB Part URL; ComponentLink2URL: https://jlcpcb.com/partdetail/C333166
pins: 1, 2
1 alternate drawing of the same symbol

## RTT122R70FTP
designator R?  Resistance: 2.7Ω  (hidden comment: *)
Resistor, 2.7Ω, ±1%, 500mW, 200V, ±200ppm/℃, -55℃~+155℃, SMD 1210; Manufacturer: Uniroyal; Manufacturer Part Number: RTT122R70FTP; Supplier 1: LCSC; Supplier Part Number 1: C159357; JLCPCB Part Number: C159357; Power Rating: 500mW; Category: Resistors; Package Size: 1210; JLCPCB Basic Part: Yes; Tolerance: ±1%; Voltage Rating: 200V; Temperature Coefficient: ±200ppm/℃; Temperature Rating: -55℃~+155℃; ComponentLink1Description: Datasheet; ComponentLink1URL: https://wmsc.lcsc.com/wmsc/upload/file/pdf/v2/lcsc/2304140030_RALEC-RTT122R70FTP_C159357.pdf; ComponentLink2Description: JLCPCB Part URL; ComponentLink2URL: https://jlcpcb.com/partdetail/C159357
pins: 1, 2
1 alternate drawing of the same symbol

## RTT123R00FTP
designator R?  Resistance: 3Ω  (hidden comment: *)
Resistor, 3Ω, ±1%, 500mW, 200V, ±200ppm/℃, -55℃~+155℃, SMD 1210; Manufacturer: Uniroyal; Manufacturer Part Number: RTT123R00FTP; Supplier 1: LCSC; Supplier Part Number 1: C159348; JLCPCB Part Number: C159348; Power Rating: 500mW; Category: Resistors; Package Size: 1210; JLCPCB Basic Part: Yes; Tolerance: ±1%; Voltage Rating: 200V; Temperature Coefficient: ±200ppm/℃; Temperature Rating: -55℃~+155℃; ComponentLink1Description: Datasheet; ComponentLink1URL: https://wmsc.lcsc.com/wmsc/upload/file/pdf/v2/lcsc/2304140030_RALEC-RTT123R00FTP_C159348.pdf; ComponentLink2Description: JLCPCB Part URL; ComponentLink2URL: https://jlcpcb.com/partdetail/C159348
pins: 1, 2
1 alternate drawing of the same symbol

## RTT123R0JTP
designator R?  Resistance: 3Ω  (hidden comment: *)
Resistor, 3Ω, ±5%, 500mW, 200V, ±200ppm/℃, -55℃~+155℃, SMD 1210; Manufacturer: Uniroyal; Manufacturer Part Number: RTT123R0JTP; Supplier 1: LCSC; Supplier Part Number 1: C105014; JLCPCB Part Number: C105014; Power Rating: 500mW; Category: Resistors; Package Size: 1210; JLCPCB Basic Part: Yes; Tolerance: ±5%; Voltage Rating: 200V; Temperature Coefficient: ±200ppm/℃; Temperature Rating: -55℃~+155℃; ComponentLink1Description: Datasheet; ComponentLink1URL: https://wmsc.lcsc.com/wmsc/upload/file/pdf/v2/lcsc/2304140030_RALEC-RTT123R0JTP_C105014.pdf; ComponentLink2Description: JLCPCB Part URL; ComponentLink2URL: https://jlcpcb.com/partdetail/C105014
pins: 1, 2
1 alternate drawing of the same symbol

## RTT123R3JTP
designator R?  Resistance: 3.3Ω  (hidden comment: *)
Resistor, 3.3Ω, ±5%, 500mW, 200V, ±200ppm/℃, -55℃~+155℃, SMD 1210; Manufacturer: Uniroyal; Manufacturer Part Number: RTT123R3JTP; Supplier 1: LCSC; Supplier Part Number 1: C105015; JLCPCB Part Number: C105015; Power Rating: 500mW; Category: Resistors; Package Size: 1210; JLCPCB Basic Part: Yes; Tolerance: ±5%; Voltage Rating: 200V; Temperature Coefficient: ±200ppm/℃; Temperature Rating: -55℃~+155℃; ComponentLink1Description: Datasheet; ComponentLink1URL: https://wmsc.lcsc.com/wmsc/upload/file/pdf/v2/lcsc/2304140030_RALEC-RTT123R3JTP_C105015.pdf; ComponentLink2Description: JLCPCB Part URL; ComponentLink2URL: https://jlcpcb.com/partdetail/C105015
pins: 1, 2
1 alternate drawing of the same symbol

## RTT123R9JTP
designator R?  Resistance: 3.9Ω  (hidden comment: *)
Resistor, 3.9Ω, ±5%, 500mW, ±200ppm/℃, SMD 1210; Manufacturer: Uniroyal; Manufacturer Part Number: RTT123R9JTP; Supplier 1: LCSC; Supplier Part Number 1: C159345; JLCPCB Part Number: C159345; Power Rating: 500mW; Category: Resistors; Package Size: 1210; JLCPCB Basic Part: Yes; Tolerance: ±5%; Temperature Coefficient: ±200ppm/℃; ComponentLink1Description: Datasheet; ComponentLink1URL: https://wmsc.lcsc.com/wmsc/upload/file/pdf/v2/lcsc/2304140030_RALEC-RTT123R9JTP_C159345.pdf; ComponentLink2Description: JLCPCB Part URL; ComponentLink2URL: https://jlcpcb.com/partdetail/C159345
pins: 1, 2
1 alternate drawing of the same symbol

## RTT123R30FTP
designator R?  Resistance: 3.3Ω  (hidden comment: *)
Resistor, 3.3Ω, ±1%, 500mW, 200V, ±200ppm/℃, -55℃~+155℃, SMD 1210; Manufacturer: Uniroyal; Manufacturer Part Number: RTT123R30FTP; Supplier 1: LCSC; Supplier Part Number 1: C159347; JLCPCB Part Number: C159347; Power Rating: 500mW; Category: Resistors; Package Size: 1210; JLCPCB Basic Part: Yes; Tolerance: ±1%; Voltage Rating: 200V; Temperature Coefficient: ±200ppm/℃; Temperature Rating: -55℃~+155℃; ComponentLink1Description: Datasheet; ComponentLink1URL: https://wmsc.lcsc.com/wmsc/upload/file/pdf/v2/lcsc/2304140030_RALEC-RTT123R30FTP_C159347.pdf; ComponentLink2Description: JLCPCB Part URL; ComponentLink2URL: https://jlcpcb.com/partdetail/C159347
pins: 1, 2
1 alternate drawing of the same symbol

## RTT123R60FTP
designator R?  Resistance: 3.6Ω  (hidden comment: *)
Resistor, 3.6Ω, ±1%, 500mW, 200V, ±200ppm/℃, -55℃~+155℃, SMD 1210; Manufacturer: Uniroyal; Manufacturer Part Number: RTT123R60FTP; Supplier 1: LCSC; Supplier Part Number 1: C105016; JLCPCB Part Number: C105016; Power Rating: 500mW; Category: Resistors; Package Size: 1210; JLCPCB Basic Part: Yes; Tolerance: ±1%; Voltage Rating: 200V; Temperature Coefficient: ±200ppm/℃; Temperature Rating: -55℃~+155℃; ComponentLink1Description: Datasheet; ComponentLink1URL: https://wmsc.lcsc.com/wmsc/upload/file/pdf/v2/lcsc/2304140030_RALEC-RTT123R60FTP_C105016.pdf; ComponentLink2Description: JLCPCB Part URL; ComponentLink2URL: https://jlcpcb.com/partdetail/C105016
pins: 1, 2
1 alternate drawing of the same symbol

## RTT123R90FTP
designator R?  Resistance: 3.9Ω  (hidden comment: *)
Resistor, 3.9Ω, ±1%, 500mW, 200V, ±200ppm/℃, -55℃~+155℃, SMD 1210; Manufacturer: Uniroyal; Manufacturer Part Number: RTT123R90FTP; Supplier 1: LCSC; Supplier Part Number 1: C159346; JLCPCB Part Number: C159346; Power Rating: 500mW; Category: Resistors; Package Size: 1210; JLCPCB Basic Part: Yes; Tolerance: ±1%; Voltage Rating: 200V; Temperature Coefficient: ±200ppm/℃; Temperature Rating: -55℃~+155℃; ComponentLink1Description: Datasheet; ComponentLink1URL: https://wmsc.lcsc.com/wmsc/upload/file/pdf/v2/lcsc/2304140030_RALEC-RTT123R90FTP_C159346.pdf; ComponentLink2Description: JLCPCB Part URL; ComponentLink2URL: https://jlcpcb.com/partdetail/C159346
pins: 1, 2
1 alternate drawing of the same symbol

## RTT124R02FTP
designator R?  Resistance: 4.02Ω  (hidden comment: *)
Resistor, 4.02Ω, ±1%, 500mW, 200V, ±200ppm/℃, -55℃~+155℃, SMD 1210; Manufacturer: Uniroyal; Manufacturer Part Number: RTT124R02FTP; Supplier 1: LCSC; Supplier Part Number 1: C333203; JLCPCB Part Number: C333203; Power Rating: 500mW; Category: Resistors; Package Size: 1210; JLCPCB Basic Part: Yes; Tolerance: ±1%; Voltage Rating: 200V; Temperature Coefficient: ±200ppm/℃; Temperature Rating: -55℃~+155℃; ComponentLink1Description: Datasheet; ComponentLink1URL: https://wmsc.lcsc.com/wmsc/upload/file/pdf/v2/lcsc/2304140030_RALEC-RTT124R02FTP_C333203.pdf; ComponentLink2Description: JLCPCB Part URL; ComponentLink2URL: https://jlcpcb.com/partdetail/C333203
pins: 1, 2
1 alternate drawing of the same symbol